# Altium footprint library JL_PCB.PCBLIB: 1129 footprints (part 66 of 72)
Each footprint in its own frame and in the unit in brackets; x right, y up, seen from the top. Pads: shape width x height; smd on the part's side, far side on the other; paste and mask are expansions set on the pad; w line width, h text height; cw(c..) or ccw(c..) is an arc to the next point about the centre after c.
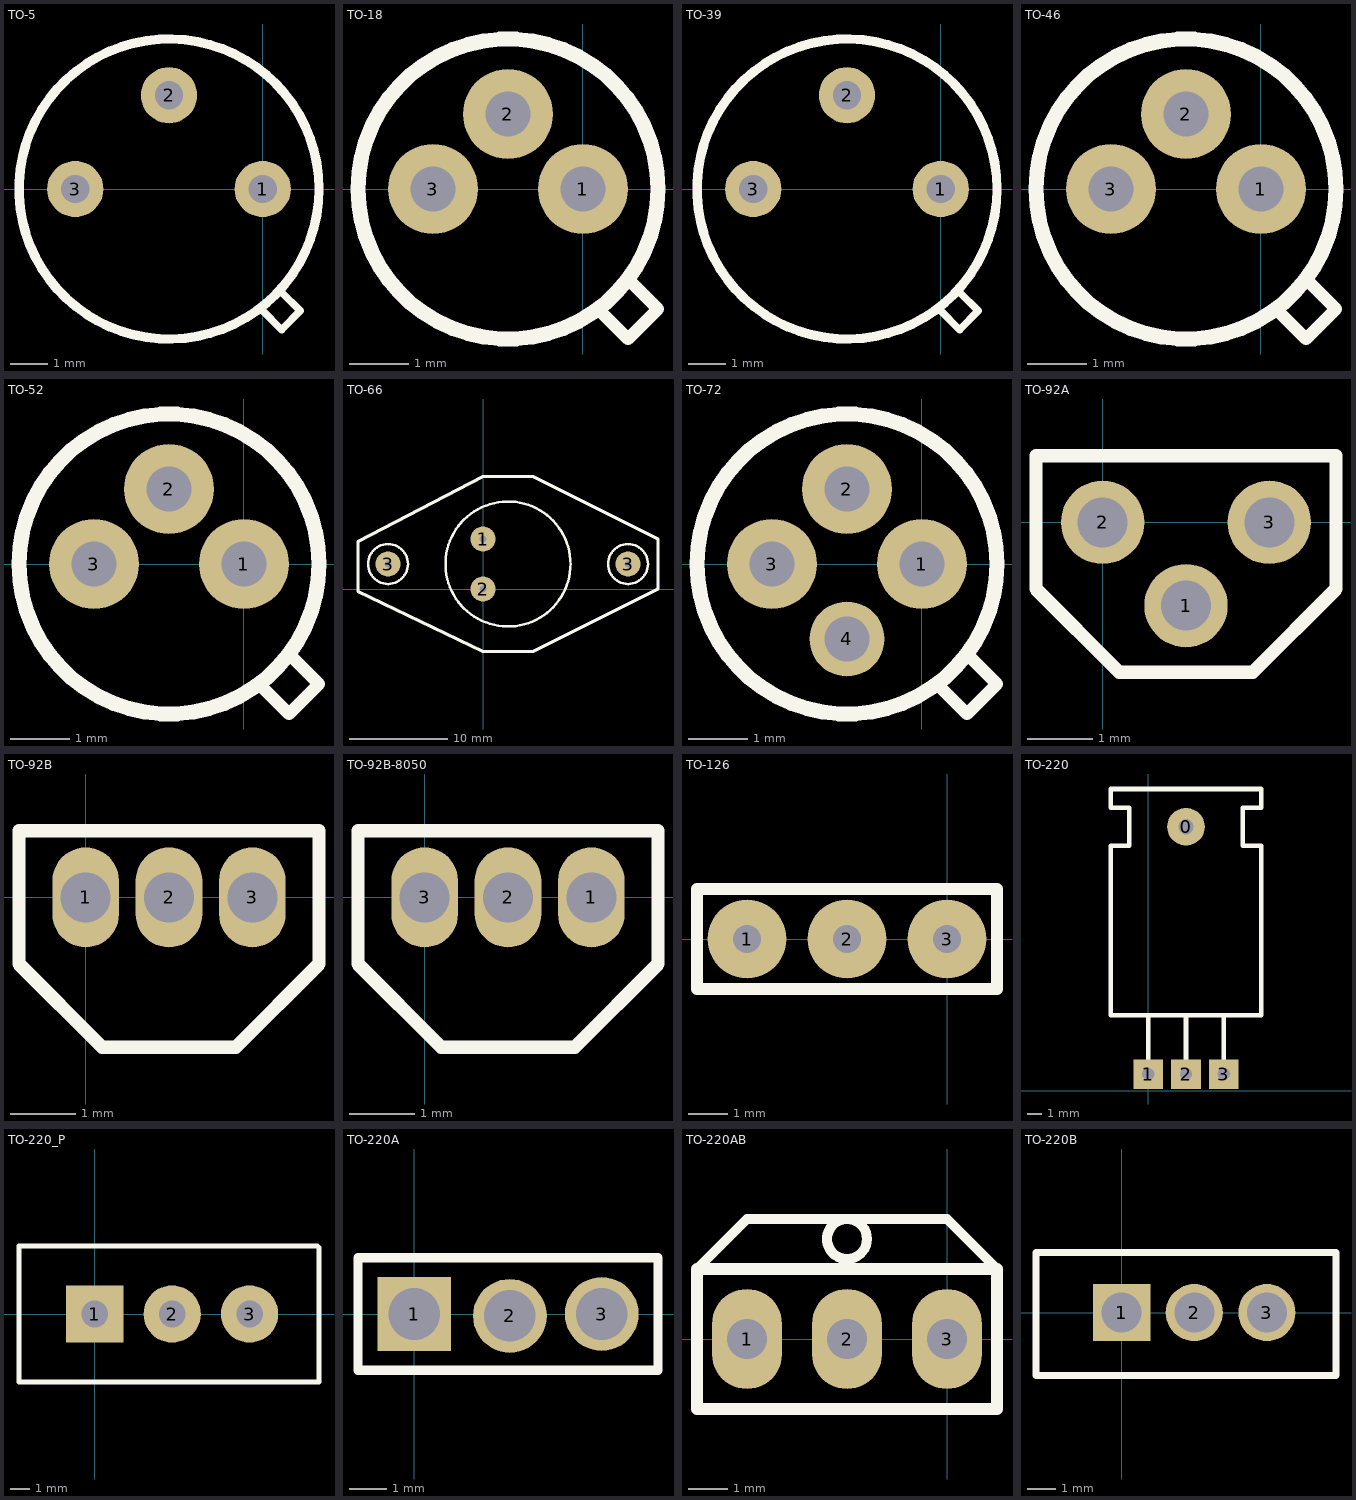
[diagram p65: the footprints below, top view; thin cyan lines are the x and y axes]

## TO-5 [mil]
pads (3):
  round 60 hole 30: 1(0,0) 2(-100,100) 3(-200,0)
TopOverlay:
  circle w10: c-100,0 r160
  lines w8: 0,-130 20,-150 40,-130 20,-110

## TO-18 [mil]
pads (3):
  round 60 hole 30: 1(0,0) 2(-50,50) 3(-100,0)
TopOverlay:
  circle w10: c-50,0 r100
  lines w8: 10,-80 30,-100 50,-80 30,-60

## TO-39 [mil]
pads (3):
  round 60 hole 30: 1(0,0) 2(-100,100) 3(-200,0)
TopOverlay:
  circle w10: c-100,0 r160
  lines w8: 0,-130 20,-150 40,-130 20,-110

## TO-46 [mil]
pads (3):
  round 60 hole 30: 1(0,0) 2(-50,50) 3(-100,0)
TopOverlay:
  circle w10: c-50,0 r100
  lines w8: 10,-80 30,-100 50,-80 30,-60

## TO-52 [mil]
pads (3):
  round 60 hole 30: 1(0,0) 2(-50,50) 3(-100,0)
TopOverlay:
  circle w10: c-50,0 r100
  lines w8: 10,-80 30,-100 50,-80 30,-60

## TO-66 [mil]
pads (4):
  round 100 hole 28: 1(0,200) 2(0,0) 3(-380,100) 3(580,100)
TopOverlay:
  circle w10: c100,100 r250
  circle w10: c-380,100 r80
  circle w10: c580,100 r80
  lines w12: -500,-10 -500,190 0,450 200,450 700,200 700,0 200,-250 0,-250 -500,-10

## TO-72 [mil]
pads (4):
  round 60 hole 30: 1(0,0) 2(-50,50) 3(-100,0)
  round 50 hole 30: 4(-50,-50)
TopOverlay:
  circle w10: c-50,0 r100
  lines w8: 10,-80 30,-100 50,-80 30,-60

## TO-92A [mil]
pads (3):
  round 50 hole 30: 1(50,-50) 2(0,0) 3(100,0)
TopOverlay:
  lines w8: -40,-40 10,-90 90,-90 140,-40 140,40 -40,40 -40,-40
3D body "TO-92-5.STEP": height 189.58, standoff -126.96, extent -58.81,-106.49 164.81,43.12

## TO-92B [mil]
pads (3):
  oval 40x60 hole 30: 1(0,0) 2(50,0) 3(100,0)
TopOverlay:
  lines w8: -40,-40 -40,40 140,40 140,-40 90,-90 10,-90 -40,-40

## TO-92B-8050 [mil]
pads (3):
  oval 40x60 hole 30: 1(100,0) 2(50,0) 3(0,0)
TopOverlay:
  lines w8: -40,-40 -40,40 140,40 140,-40 90,-90 10,-90 -40,-40

## TO-126 [mm]
pads (3):
  round 2 hole 0.711: 1(-5.08,0) 2(-2.54,0) 3(0,0)
TopOverlay:
  lines w0.305: -6.35,-1.27 1.27,-1.27 1.27,1.27 -6.35,1.27 -6.35,-1.27

## TO-220 [mil]
pads (4):
  round 100 hole 40: 0(100,700)
  rect 78.74x78.74 hole 32: 1(0,44) 2(100,44) 3(200,44)
TopOverlay:
  lines w12: 0,60 0,200 ; 100,60 100,200 ; 200,60 200,200 ; -100,200 -100,650 -50,650 -50,750 -100,750 -100,800 300,800 300,750 250,750 250,650 300,650 300,200 -100,200
3D body "SW3DPS-TO-220-DEFAULT.STEP": height 165.96, standoff -117.51, extent -99,36.34 301,803.66

## TO-220_P [mm]
pads (3):
  rect 3x3 hole 1.4: 1(0,0)
  round 3 hole 1.4: 2(4.06,0) 3(8.12,0)
TopOverlay:
  lines w0.254: 11.68,3.556 -3.966,3.556 -3.966,-3.556 11.756,-3.556 11.756,3.48

## TO-220A [mm]
pads (3):
  rect 2x2 hole 1.4: 1(0,0)
  round 2 hole 1.4: 2(2.591,-0.051) 3(5.08,0)
TopOverlay:
  lines w0.254: -1.524,-1.524 -1.524,1.524 -1.016,1.524 6.604,1.524 6.604,-1.524 -1.016,-1.524 -1.524,-1.524
3D body "TO-220.STEP": height 15.82, standoff -1.98, extent -2.578,-3.063 7.722,1.437

## TO-220AB [mil]
pads (3):
  oval 70x100 hole 40: 1(-200,0) 2(-100,0) 3(0,0)
TopOverlay:
  circle w10: c-100,100 r20
  lines w10: -250,70 -200,120 0,120 50,70
  lines w12: -250,-70 -250,70 50,70 50,-70 -250,-70
3D body "TO-220.STEP": height 622.65, standoff -78.14, extent -301.51,-61.58 104,115.58

## TO-220B [mm]
pads (3):
  rect 2x2 hole 1.4: 1(0,0)
  round 2 hole 1.4: 2(2.54,0) 3(5.08,0)
TopOverlay:
  lines w0.254: -2.3,2.1 -2,2.1 ; -2,2.1 -3,2.1 -3,-2.2 7.5,-2.2 7.5,2.1 -2,2.1